# Altium footprint library Package_QFP.PcbLib: 84 footprints (part 3 of 6) (continued)
## LQFP-144_20x20mm_P0.5mm [mm]
pads (144):
  rrect25% 1.475x0.3 smd: 1(-10.663,8.75) 2(-10.663,8.25) 3(-10.663,7.75) 4(-10.663,7.25) 5(-10.663,6.75) 6(-10.663,6.25) 7(-10.663,5.75) 8(-10.663,5.25) 9(-10.663,4.75) 10(-10.663,4.25) 11(-10.663,3.75) 12(-10.663,3.25) 13(-10.663,2.75) 14(-10.663,2.25) 15(-10.663,1.75) 16(-10.663,1.25) 17(-10.663,0.75) 18(-10.663,0.25) 19(-10.663,-0.25) 20(-10.663,-0.75) 21(-10.663,-1.25) 22(-10.663,-1.75) 23(-10.663,-2.25) 24(-10.663,-2.75) 25(-10.663,-3.25) 26(-10.663,-3.75) 27(-10.663,-4.25) 28(-10.663,-4.75) 29(-10.663,-5.25) 30(-10.663,-5.75) 31(-10.663,-6.25) 32(-10.663,-6.75) 33(-10.663,-7.25) 34(-10.663,-7.75) 35(-10.663,-8.25) 36(-10.663,-8.75) 73(10.663,-8.75) 74(10.663,-8.25) 75(10.663,-7.75) 76(10.663,-7.25) 77(10.663,-6.75) 78(10.663,-6.25) 79(10.663,-5.75) 80(10.663,-5.25) 81(10.663,-4.75) 82(10.663,-4.25) 83(10.663,-3.75) 84(10.663,-3.25) 85(10.663,-2.75) 86(10.663,-2.25) 87(10.663,-1.75) 88(10.663,-1.25) 89(10.663,-0.75) 90(10.663,-0.25) 91(10.663,0.25) 92(10.663,0.75) 93(10.663,1.25) 94(10.663,1.75) 95(10.663,2.25) 96(10.663,2.75) 97(10.663,3.25) 98(10.663,3.75) 99(10.663,4.25) 100(10.663,4.75) 101(10.663,5.25) 102(10.663,5.75) 103(10.663,6.25) 104(10.663,6.75) 105(10.663,7.25) 106(10.663,7.75) 107(10.663,8.25) 108(10.663,8.75)
  rrect25% 0.3x1.475 smd: 37(-8.75,-10.663) 38(-8.25,-10.663) 39(-7.75,-10.663) 40(-7.25,-10.663) 41(-6.75,-10.663) 42(-6.25,-10.663) 43(-5.75,-10.663) 44(-5.25,-10.663) 45(-4.75,-10.663) 46(-4.25,-10.663) 47(-3.75,-10.663) 48(-3.25,-10.663) 49(-2.75,-10.663) 50(-2.25,-10.663) 51(-1.75,-10.663) 52(-1.25,-10.663) 53(-0.75,-10.663) 54(-0.25,-10.663) 55(0.25,-10.663) 56(0.75,-10.663) 57(1.25,-10.663) 58(1.75,-10.663) 59(2.25,-10.663) 60(2.75,-10.663) 61(3.25,-10.663) 62(3.75,-10.663) 63(4.25,-10.663) 64(4.75,-10.663) 65(5.25,-10.663) 66(5.75,-10.663) 67(6.25,-10.663) 68(6.75,-10.663) 69(7.25,-10.663) 70(7.75,-10.663) 71(8.25,-10.663) 72(8.75,-10.663) 109(8.75,10.663) 110(8.25,10.663) 111(7.75,10.663) 112(7.25,10.663) 113(6.75,10.663) 114(6.25,10.663) 115(5.75,10.663) 116(5.25,10.663) 117(4.75,10.663) 118(4.25,10.663) 119(3.75,10.663) 120(3.25,10.663) 121(2.75,10.663) 122(2.25,10.663) 123(1.75,10.663) 124(1.25,10.663) 125(0.75,10.663) 126(0.25,10.663) 127(-0.25,10.663) 128(-0.75,10.663) 129(-1.25,10.663) 130(-1.75,10.663) 131(-2.25,10.663) 132(-2.75,10.663) 133(-3.25,10.663) 134(-3.75,10.663) 135(-4.25,10.663) 136(-4.75,10.663) 137(-5.25,10.663) 138(-5.75,10.663) 139(-6.25,10.663) 140(-6.75,10.663) 141(-7.25,10.663) 142(-7.75,10.663) 143(-8.25,10.663) 144(-8.75,10.663)
F.SilkS:
  lines w0.12: -11.4,9.16 -10.11,9.16 -10.11,10.11 -9.16,10.11 ; -10.11,-9.16 -10.11,-10.11 -9.16,-10.11 ; 9.16,-10.11 10.11,-10.11 10.11,-9.16 ; 9.16,10.11 10.11,10.11 10.11,9.16
F.CrtYd:
  lines w0.05: -11.65,-9.15 -11.65,0 -11.65,9.15 -10.25,9.15 -10.25,10.25 -9.15,10.25 -9.15,11.65 0,11.65 9.15,11.65 9.15,10.25 10.25,10.25 10.25,9.15 11.65,9.15 11.65,0 11.65,-9.15 10.25,-9.15 10.25,-10.25 9.15,-10.25 9.15,-11.65 0,-11.65 -9.15,-11.65 -9.15,-10.25 -10.25,-10.25 -10.25,-9.15 -11.65,-9.15
F.Fab:
  lines w0.1: -10,-10 10,-10 10,10 -9,10 -10,9 -10,-10
  text "'.Designator'" at -3.897,-0.357 h1
3D body "LQFP-144_20x20mm_P0.5mm.step": height 1.5, standoff 0, extent -11,-11 11,11

## LQFP-160_24x24mm_P0.5mm [mm]
pads (160):
  rrect25% 1.5x0.3 smd: 1(-12.675,9.75) 2(-12.675,9.25) 3(-12.675,8.75) 4(-12.675,8.25) 5(-12.675,7.75) 6(-12.675,7.25) 7(-12.675,6.75) 8(-12.675,6.25) 9(-12.675,5.75) 10(-12.675,5.25) 11(-12.675,4.75) 12(-12.675,4.25) 13(-12.675,3.75) 14(-12.675,3.25) 15(-12.675,2.75) 16(-12.675,2.25) 17(-12.675,1.75) 18(-12.675,1.25) 19(-12.675,0.75) 20(-12.675,0.25) 21(-12.675,-0.25) 22(-12.675,-0.75) 23(-12.675,-1.25) 24(-12.675,-1.75) 25(-12.675,-2.25) 26(-12.675,-2.75) 27(-12.675,-3.25) 28(-12.675,-3.75) 29(-12.675,-4.25) 30(-12.675,-4.75) 31(-12.675,-5.25) 32(-12.675,-5.75) 33(-12.675,-6.25) 34(-12.675,-6.75) 35(-12.675,-7.25) 36(-12.675,-7.75) 37(-12.675,-8.25) 38(-12.675,-8.75) 39(-12.675,-9.25) 40(-12.675,-9.75) 81(12.675,-9.75) 82(12.675,-9.25) 83(12.675,-8.75) 84(12.675,-8.25) 85(12.675,-7.75) 86(12.675,-7.25) 87(12.675,-6.75) 88(12.675,-6.25) 89(12.675,-5.75) 90(12.675,-5.25) 91(12.675,-4.75) 92(12.675,-4.25) 93(12.675,-3.75) 94(12.675,-3.25) 95(12.675,-2.75) 96(12.675,-2.25) 97(12.675,-1.75) 98(12.675,-1.25) 99(12.675,-0.75) 100(12.675,-0.25) 101(12.675,0.25) 102(12.675,0.75) 103(12.675,1.25) 104(12.675,1.75) 105(12.675,2.25) 106(12.675,2.75) 107(12.675,3.25) 108(12.675,3.75) 109(12.675,4.25) 110(12.675,4.75) 111(12.675,5.25) 112(12.675,5.75) 113(12.675,6.25) 114(12.675,6.75) 115(12.675,7.25) 116(12.675,7.75) 117(12.675,8.25) 118(12.675,8.75) 119(12.675,9.25) 120(12.675,9.75)
  rrect25% 0.3x1.5 smd: 41(-9.75,-12.675) 42(-9.25,-12.675) 43(-8.75,-12.675) 44(-8.25,-12.675) 45(-7.75,-12.675) 46(-7.25,-12.675) 47(-6.75,-12.675) 48(-6.25,-12.675) 49(-5.75,-12.675) 50(-5.25,-12.675) 51(-4.75,-12.675) 52(-4.25,-12.675) 53(-3.75,-12.675) 54(-3.25,-12.675) 55(-2.75,-12.675) 56(-2.25,-12.675) 57(-1.75,-12.675) 58(-1.25,-12.675) 59(-0.75,-12.675) 60(-0.25,-12.675) 61(0.25,-12.675) 62(0.75,-12.675) 63(1.25,-12.675) 64(1.75,-12.675) 65(2.25,-12.675) 66(2.75,-12.675) 67(3.25,-12.675) 68(3.75,-12.675) 69(4.25,-12.675) 70(4.75,-12.675) 71(5.25,-12.675) 72(5.75,-12.675) 73(6.25,-12.675) 74(6.75,-12.675) 75(7.25,-12.675) 76(7.75,-12.675) 77(8.25,-12.675) 78(8.75,-12.675) 79(9.25,-12.675) 80(9.75,-12.675) 121(9.75,12.675) 122(9.25,12.675) 123(8.75,12.675) 124(8.25,12.675) 125(7.75,12.675) 126(7.25,12.675) 127(6.75,12.675) 128(6.25,12.675) 129(5.75,12.675) 130(5.25,12.675) 131(4.75,12.675) 132(4.25,12.675) 133(3.75,12.675) 134(3.25,12.675) 135(2.75,12.675) 136(2.25,12.675) 137(1.75,12.675) 138(1.25,12.675) 139(0.75,12.675) 140(0.25,12.675) 141(-0.25,12.675) 142(-0.75,12.675) 143(-1.25,12.675) 144(-1.75,12.675) 145(-2.25,12.675) 146(-2.75,12.675) 147(-3.25,12.675) 148(-3.75,12.675) 149(-4.25,12.675) 150(-4.75,12.675) 151(-5.25,12.675) 152(-5.75,12.675) 153(-6.25,12.675) 154(-6.75,12.675) 155(-7.25,12.675) 156(-7.75,12.675) 157(-8.25,12.675) 158(-8.75,12.675) 159(-9.25,12.675) 160(-9.75,12.675)
F.SilkS:
  lines w0.12: -13.425,10.16 -12.11,10.16 -12.11,12.11 -10.16,12.11 ; -12.11,-10.16 -12.11,-12.11 -10.16,-12.11 ; 10.16,-12.11 12.11,-12.11 12.11,-10.16 ; 10.16,12.11 12.11,12.11 12.11,10.16
F.CrtYd:
  lines w0.05: -13.68,-10.15 -13.68,0 -13.68,10.15 -12.25,10.15 -12.25,12.25 -10.15,12.25 -10.15,13.68 0,13.68 10.15,13.68 10.15,12.25 12.25,12.25 12.25,10.15 13.68,10.15 13.68,0 13.68,-10.15 12.25,-10.15 12.25,-12.25 10.15,-12.25 10.15,-13.68 0,-13.68 -10.15,-13.68 -10.15,-12.25 -12.25,-12.25 -12.25,-10.15 -13.68,-10.15
F.Fab:
  lines w0.1: -12,-12 -12,11 -11,12 12,12 12,-12 -12,-12
  text "'.Designator'" at -4.047,-0.84 h1
3D body "LQFP-160_24x24mm_P0.5mm.step": height 1.5, standoff 0, extent -13,-13 13,13

## LQFP-176_20x20mm_P0.4mm [mm]
pads (176):
  rrect25% 1.475x0.2 smd: 1(-10.713,8.6) 2(-10.713,8.2) 3(-10.713,7.8) 4(-10.713,7.4) 5(-10.713,7) 6(-10.713,6.6) 7(-10.713,6.2) 8(-10.713,5.8) 9(-10.713,5.4) 10(-10.713,5) 11(-10.713,4.6) 12(-10.713,4.2) 13(-10.713,3.8) 14(-10.713,3.4) 15(-10.713,3) 16(-10.713,2.6) 17(-10.713,2.2) 18(-10.713,1.8) 19(-10.713,1.4) 20(-10.713,1) 21(-10.713,0.6) 22(-10.713,0.2) 23(-10.713,-0.2) 24(-10.713,-0.6) 25(-10.713,-1) 26(-10.713,-1.4) 27(-10.713,-1.8) 28(-10.713,-2.2) 29(-10.713,-2.6) 30(-10.713,-3) 31(-10.713,-3.4) 32(-10.713,-3.8) 33(-10.713,-4.2) 34(-10.713,-4.6) 35(-10.713,-5) 36(-10.713,-5.4) 37(-10.713,-5.8) 38(-10.713,-6.2) 39(-10.713,-6.6) 40(-10.713,-7) 41(-10.713,-7.4) 42(-10.713,-7.8) 43(-10.713,-8.2) 44(-10.713,-8.6) 89(10.713,-8.6) 90(10.713,-8.2) 91(10.713,-7.8) 92(10.713,-7.4) 93(10.713,-7) 94(10.713,-6.6) 95(10.713,-6.2) 96(10.713,-5.8) 97(10.713,-5.4) 98(10.713,-5) 99(10.713,-4.6) 100(10.713,-4.2) 101(10.713,-3.8) 102(10.713,-3.4) 103(10.713,-3) 104(10.713,-2.6) 105(10.713,-2.2) 106(10.713,-1.8) 107(10.713,-1.4) 108(10.713,-1) 109(10.713,-0.6) 110(10.713,-0.2) 111(10.713,0.2) 112(10.713,0.6) 113(10.713,1) 114(10.713,1.4) 115(10.713,1.8) 116(10.713,2.2) 117(10.713,2.6) 118(10.713,3) 119(10.713,3.4) 120(10.713,3.8) 121(10.713,4.2) 122(10.713,4.6) 123(10.713,5) 124(10.713,5.4) 125(10.713,5.8) 126(10.713,6.2) 127(10.713,6.6) 128(10.713,7) 129(10.713,7.4) 130(10.713,7.8) 131(10.713,8.2) 132(10.713,8.6)
  rrect25% 0.2x1.475 smd: 45(-8.6,-10.713) 46(-8.2,-10.713) 47(-7.8,-10.713) 48(-7.4,-10.713) 49(-7,-10.713) 50(-6.6,-10.713) 51(-6.2,-10.713) 52(-5.8,-10.713) 53(-5.4,-10.713) 54(-5,-10.713) 55(-4.6,-10.713) 56(-4.2,-10.713) 57(-3.8,-10.713) 58(-3.4,-10.713) 59(-3,-10.713) 60(-2.6,-10.713) 61(-2.2,-10.713) 62(-1.8,-10.713) 63(-1.4,-10.713) 64(-1,-10.713) 65(-0.6,-10.713) 66(-0.2,-10.713) 67(0.2,-10.713) 68(0.6,-10.713) 69(1,-10.713) 70(1.4,-10.713) 71(1.8,-10.713) 72(2.2,-10.713) 73(2.6,-10.713) 74(3,-10.713) 75(3.4,-10.713) 76(3.8,-10.713) 77(4.2,-10.713) 78(4.6,-10.713) 79(5,-10.713) 80(5.4,-10.713) 81(5.8,-10.713) 82(6.2,-10.713) 83(6.6,-10.713) 84(7,-10.713) 85(7.4,-10.713) 86(7.8,-10.713) 87(8.2,-10.713) 88(8.6,-10.713) 133(8.6,10.713) 134(8.2,10.713) 135(7.8,10.713) 136(7.4,10.713) 137(7,10.713) 138(6.6,10.713) 139(6.2,10.713) 140(5.8,10.713) 141(5.4,10.713) 142(5,10.713) 143(4.6,10.713) 144(4.2,10.713) 145(3.8,10.713) 146(3.4,10.713) 147(3,10.713) 148(2.6,10.713) 149(2.2,10.713) 150(1.8,10.713) 151(1.4,10.713) 152(1,10.713) 153(0.6,10.713) 154(0.2,10.713) 155(-0.2,10.713) 156(-0.6,10.713) 157(-1,10.713) 158(-1.4,10.713) 159(-1.8,10.713) 160(-2.2,10.713) 161(-2.6,10.713) 162(-3,10.713) 163(-3.4,10.713) 164(-3.8,10.713) 165(-4.2,10.713) 166(-4.6,10.713) 167(-5,10.713) 168(-5.4,10.713) 169(-5.8,10.713) 170(-6.2,10.713) 171(-6.6,10.713) 172(-7,10.713) 173(-7.4,10.713) 174(-7.8,10.713) 175(-8.2,10.713) 176(-8.6,10.713)
F.SilkS:
  lines w0.12: -11.45,8.96 -10.11,8.96 -10.11,10.11 -8.96,10.11 ; -10.11,-8.96 -10.11,-10.11 -8.96,-10.11 ; 8.96,-10.11 10.11,-10.11 10.11,-8.96 ; 8.96,10.11 10.11,10.11 10.11,8.96
F.CrtYd:
  lines w0.05: -11.7,-8.95 -10.25,-8.95 -10.25,-10.25 -8.95,-10.25 -8.95,-11.7 0,-11.7 8.95,-11.7 8.95,-10.25 10.25,-10.25 10.25,-8.95 11.7,-8.95 11.7,0 11.7,8.95 10.25,8.95 10.25,10.25 8.95,10.25 8.95,11.7 0,11.7 -8.95,11.7 -8.95,10.25 -10.25,10.25 -10.25,8.95 -11.7,8.95 -11.7,0 -11.7,-8.95
F.Fab:
  lines w0.1: -10,-10 -10,9 -9,10 10,10 10,-10 -10,-10
  text "'.Designator'" at -4.047,-0.84 h1
3D body "LQFP-176_20x20mm_P0.4mm.step": height 1.5, standoff 0, extent -11,-11 11,11

## LQFP-176_24x24mm_P0.5mm [mm]
pads (176):
  rrect25% 1.5x0.3 smd: 1(-12.675,10.75) 2(-12.675,10.25) 3(-12.675,9.75) 4(-12.675,9.25) 5(-12.675,8.75) 6(-12.675,8.25) 7(-12.675,7.75) 8(-12.675,7.25) 9(-12.675,6.75) 10(-12.675,6.25) 11(-12.675,5.75) 12(-12.675,5.25) 13(-12.675,4.75) 14(-12.675,4.25) 15(-12.675,3.75) 16(-12.675,3.25) 17(-12.675,2.75) 18(-12.675,2.25) 19(-12.675,1.75) 20(-12.675,1.25) 21(-12.675,0.75) 22(-12.675,0.25) 23(-12.675,-0.25) 24(-12.675,-0.75) 25(-12.675,-1.25) 26(-12.675,-1.75) 27(-12.675,-2.25) 28(-12.675,-2.75) 29(-12.675,-3.25) 30(-12.675,-3.75) 31(-12.675,-4.25) 32(-12.675,-4.75) 33(-12.675,-5.25) 34(-12.675,-5.75) 35(-12.675,-6.25) 36(-12.675,-6.75) 37(-12.675,-7.25) 38(-12.675,-7.75) 39(-12.675,-8.25) 40(-12.675,-8.75) 41(-12.675,-9.25) 42(-12.675,-9.75) 43(-12.675,-10.25) 44(-12.675,-10.75) 89(12.675,-10.75) 90(12.675,-10.25) 91(12.675,-9.75) 92(12.675,-9.25) 93(12.675,-8.75) 94(12.675,-8.25) 95(12.675,-7.75) 96(12.675,-7.25) 97(12.675,-6.75) 98(12.675,-6.25) 99(12.675,-5.75) 100(12.675,-5.25) 101(12.675,-4.75) 102(12.675,-4.25) 103(12.675,-3.75) 104(12.675,-3.25) 105(12.675,-2.75) 106(12.675,-2.25) 107(12.675,-1.75) 108(12.675,-1.25) 109(12.675,-0.75) 110(12.675,-0.25) 111(12.675,0.25) 112(12.675,0.75) 113(12.675,1.25) 114(12.675,1.75) 115(12.675,2.25) 116(12.675,2.75) 117(12.675,3.25) 118(12.675,3.75) 119(12.675,4.25) 120(12.675,4.75) 121(12.675,5.25) 122(12.675,5.75) 123(12.675,6.25) 124(12.675,6.75) 125(12.675,7.25) 126(12.675,7.75) 127(12.675,8.25) 128(12.675,8.75) 129(12.675,9.25) 130(12.675,9.75) 131(12.675,10.25) 132(12.675,10.75)
  rrect25% 0.3x1.5 smd: 45(-10.75,-12.675) 46(-10.25,-12.675) 47(-9.75,-12.675) 48(-9.25,-12.675) 49(-8.75,-12.675) 50(-8.25,-12.675) 51(-7.75,-12.675) 52(-7.25,-12.675) 53(-6.75,-12.675) 54(-6.25,-12.675) 55(-5.75,-12.675) 56(-5.25,-12.675) 57(-4.75,-12.675) 58(-4.25,-12.675) 59(-3.75,-12.675) 60(-3.25,-12.675) 61(-2.75,-12.675) 62(-2.25,-12.675) 63(-1.75,-12.675) 64(-1.25,-12.675) 65(-0.75,-12.675) 66(-0.25,-12.675) 67(0.25,-12.675) 68(0.75,-12.675) 69(1.25,-12.675) 70(1.75,-12.675) 71(2.25,-12.675) 72(2.75,-12.675) 73(3.25,-12.675) 74(3.75,-12.675) 75(4.25,-12.675) 76(4.75,-12.675) 77(5.25,-12.675) 78(5.75,-12.675) 79(6.25,-12.675) 80(6.75,-12.675) 81(7.25,-12.675) 82(7.75,-12.675) 83(8.25,-12.675) 84(8.75,-12.675) 85(9.25,-12.675) 86(9.75,-12.675) 87(10.25,-12.675) 88(10.75,-12.675) 133(10.75,12.675) 134(10.25,12.675) 135(9.75,12.675) 136(9.25,12.675) 137(8.75,12.675) 138(8.25,12.675) 139(7.75,12.675) 140(7.25,12.675) 141(6.75,12.675) 142(6.25,12.675) 143(5.75,12.675) 144(5.25,12.675) 145(4.75,12.675) 146(4.25,12.675) 147(3.75,12.675) 148(3.25,12.675) 149(2.75,12.675) 150(2.25,12.675) 151(1.75,12.675) 152(1.25,12.675) 153(0.75,12.675) 154(0.25,12.675) 155(-0.25,12.675) 156(-0.75,12.675) 157(-1.25,12.675) 158(-1.75,12.675) 159(-2.25,12.675) 160(-2.75,12.675) 161(-3.25,12.675) 162(-3.75,12.675) 163(-4.25,12.675) 164(-4.75,12.675) 165(-5.25,12.675) 166(-5.75,12.675) 167(-6.25,12.675) 168(-6.75,12.675) 169(-7.25,12.675) 170(-7.75,12.675) 171(-8.25,12.675) 172(-8.75,12.675) 173(-9.25,12.675) 174(-9.75,12.675) 175(-10.25,12.675) 176(-10.75,12.675)
F.SilkS:
  lines w0.12: -13.425,11.16 -12.11,11.16 -12.11,12.11 -11.16,12.11 ; -12.11,-11.16 -12.11,-12.11 -11.16,-12.11 ; 11.16,-12.11 12.11,-12.11 12.11,-11.16 ; 11.16,12.11 12.11,12.11 12.11,11.16
F.CrtYd:
  lines w0.05: -13.68,-11.15 -12.25,-11.15 -12.25,-12.25 -11.15,-12.25 -11.15,-13.68 0,-13.68 11.15,-13.68 11.15,-12.25 12.25,-12.25 12.25,-11.15 13.68,-11.15 13.68,0 13.68,11.15 12.25,11.15 12.25,12.25 11.15,12.25 11.15,13.68 0,13.68 -11.15,13.68 -11.15,12.25 -12.25,12.25 -12.25,11.15 -13.68,11.15 -13.68,0 -13.68,-11.15
F.Fab:
  lines w0.1: -12,-12 -12,11 -11,12 12,12 12,-12 -12,-12
  text "'.Designator'" at -4.047,-0.84 h1
3D body "LQFP-176_24x24mm_P0.5mm.step": height 1.5, standoff 0, extent -13,-13 13,13

## LQFP-208_28x28mm_P0.5mm [mm]
pads (208):
  rrect25% 1.5x0.3 smd: 1(-14.675,12.75) 2(-14.675,12.25) 3(-14.675,11.75) 4(-14.675,11.25) 5(-14.675,10.75) 6(-14.675,10.25) 7(-14.675,9.75) 8(-14.675,9.25) 9(-14.675,8.75) 10(-14.675,8.25) 11(-14.675,7.75) 12(-14.675,7.25) 13(-14.675,6.75) 14(-14.675,6.25) 15(-14.675,5.75) 16(-14.675,5.25) 17(-14.675,4.75) 18(-14.675,4.25) 19(-14.675,3.75) 20(-14.675,3.25) 21(-14.675,2.75) 22(-14.675,2.25) 23(-14.675,1.75) 24(-14.675,1.25) 25(-14.675,0.75) 26(-14.675,0.25) 27(-14.675,-0.25) 28(-14.675,-0.75) 29(-14.675,-1.25) 30(-14.675,-1.75) 31(-14.675,-2.25) 32(-14.675,-2.75) 33(-14.675,-3.25) 34(-14.675,-3.75) 35(-14.675,-4.25) 36(-14.675,-4.75) 37(-14.675,-5.25) 38(-14.675,-5.75) 39(-14.675,-6.25) 40(-14.675,-6.75) 41(-14.675,-7.25) 42(-14.675,-7.75) 43(-14.675,-8.25) 44(-14.675,-8.75) 45(-14.675,-9.25) 46(-14.675,-9.75) 47(-14.675,-10.25) 48(-14.675,-10.75) 49(-14.675,-11.25) 50(-14.675,-11.75) 51(-14.675,-12.25) 52(-14.675,-12.75) 105(14.675,-12.75) 106(14.675,-12.25) 107(14.675,-11.75) 108(14.675,-11.25) 109(14.675,-10.75) 110(14.675,-10.25) 111(14.675,-9.75) 112(14.675,-9.25) 113(14.675,-8.75) 114(14.675,-8.25) 115(14.675,-7.75) 116(14.675,-7.25) 117(14.675,-6.75) 118(14.675,-6.25) 119(14.675,-5.75) 120(14.675,-5.25) 121(14.675,-4.75) 122(14.675,-4.25) 123(14.675,-3.75) 124(14.675,-3.25) 125(14.675,-2.75) 126(14.675,-2.25) 127(14.675,-1.75) 128(14.675,-1.25) 129(14.675,-0.75) 130(14.675,-0.25) 131(14.675,0.25) 132(14.675,0.75) 133(14.675,1.25) 134(14.675,1.75) 135(14.675,2.25) 136(14.675,2.75) 137(14.675,3.25) 138(14.675,3.75) 139(14.675,4.25) 140(14.675,4.75) 141(14.675,5.25) 142(14.675,5.75) 143(14.675,6.25) 144(14.675,6.75) 145(14.675,7.25) 146(14.675,7.75) 147(14.675,8.25) 148(14.675,8.75) 149(14.675,9.25) 150(14.675,9.75) 151(14.675,10.25) 152(14.675,10.75) 153(14.675,11.25) 154(14.675,11.75) 155(14.675,12.25) 156(14.675,12.75)
  rrect25% 0.3x1.5 smd: 53(-12.75,-14.675) 54(-12.25,-14.675) 55(-11.75,-14.675) 56(-11.25,-14.675) 57(-10.75,-14.675) 58(-10.25,-14.675) 59(-9.75,-14.675) 60(-9.25,-14.675) 61(-8.75,-14.675) 62(-8.25,-14.675) 63(-7.75,-14.675) 64(-7.25,-14.675) 65(-6.75,-14.675) 66(-6.25,-14.675) 67(-5.75,-14.675) 68(-5.25,-14.675) 69(-4.75,-14.675) 70(-4.25,-14.675) 71(-3.75,-14.675) 72(-3.25,-14.675) 73(-2.75,-14.675) 74(-2.25,-14.675) 75(-1.75,-14.675) 76(-1.25,-14.675) 77(-0.75,-14.675) 78(-0.25,-14.675) 79(0.25,-14.675) 80(0.75,-14.675) 81(1.25,-14.675) 82(1.75,-14.675) 83(2.25,-14.675) 84(2.75,-14.675) 85(3.25,-14.675) 86(3.75,-14.675) 87(4.25,-14.675) 88(4.75,-14.675) 89(5.25,-14.675) 90(5.75,-14.675) 91(6.25,-14.675) 92(6.75,-14.675) 93(7.25,-14.675) 94(7.75,-14.675) 95(8.25,-14.675) 96(8.75,-14.675) 97(9.25,-14.675) 98(9.75,-14.675) 99(10.25,-14.675) 100(10.75,-14.675) 101(11.25,-14.675) 102(11.75,-14.675) 103(12.25,-14.675) 104(12.75,-14.675) 157(12.75,14.675) 158(12.25,14.675) 159(11.75,14.675) 160(11.25,14.675) 161(10.75,14.675) 162(10.25,14.675) 163(9.75,14.675) 164(9.25,14.675) 165(8.75,14.675) 166(8.25,14.675) 167(7.75,14.675) 168(7.25,14.675) 169(6.75,14.675) 170(6.25,14.675) 171(5.75,14.675) 172(5.25,14.675) 173(4.75,14.675) 174(4.25,14.675) 175(3.75,14.675) 176(3.25,14.675) 177(2.75,14.675) 178(2.25,14.675) 179(1.75,14.675) 180(1.25,14.675) 181(0.75,14.675) 182(0.25,14.675) 183(-0.25,14.675) 184(-0.75,14.675) 185(-1.25,14.675) 186(-1.75,14.675) 187(-2.25,14.675) 188(-2.75,14.675) 189(-3.25,14.675) 190(-3.75,14.675) 191(-4.25,14.675) 192(-4.75,14.675) 193(-5.25,14.675) 194(-5.75,14.675) 195(-6.25,14.675) 196(-6.75,14.675) 197(-7.25,14.675) 198(-7.75,14.675) 199(-8.25,14.675) 200(-8.75,14.675) 201(-9.25,14.675) 202(-9.75,14.675) 203(-10.25,14.675) 204(-10.75,14.675) 205(-11.25,14.675) 206(-11.75,14.675) 207(-12.25,14.675) 208(-12.75,14.675)
F.SilkS:
  lines w0.12: -15.425,13.16 -14.11,13.16 -14.11,14.11 -13.16,14.11 ; -14.11,-13.16 -14.11,-14.11 -13.16,-14.11 ; 13.16,-14.11 14.11,-14.11 14.11,-13.16 ; 13.16,14.11 14.11,14.11 14.11,13.16
F.CrtYd:
  lines w0.05: -15.68,-13.15 -14.25,-13.15 -14.25,-14.25 -13.15,-14.25 -13.15,-15.68 0,-15.68 13.15,-15.68 13.15,-14.25 14.25,-14.25 14.25,-13.15 15.68,-13.15 15.68,0 15.68,13.15 14.25,13.15 14.25,14.25 13.15,14.25 13.15,15.68 0,15.68 -13.15,15.68 -13.15,14.25 -14.25,14.25 -14.25,13.15 -15.68,13.15 -15.68,0 -15.68,-13.15
F.Fab:
  lines w0.1: -14,-14 14,-14 14,14 -13,14 -14,13 -14,-14
  text "'.Designator'" at -4.047,-0.84 h1
3D body "LQFP-208_28x28mm_P0.5mm.step": height 1.5, standoff 0, extent -15,-15 15,15

## LQFP-216_24x24mm_P0.4mm [mm]
pads (216):
  rrect25% 1.475x0.25 smd: 1(-12.662,10.6) 2(-12.662,10.2) 3(-12.662,9.8) 4(-12.662,9.4) 5(-12.662,9) 6(-12.662,8.6) 7(-12.662,8.2) 8(-12.662,7.8) 9(-12.662,7.4) 10(-12.662,7) 11(-12.662,6.6) 12(-12.662,6.2) 13(-12.662,5.8) 14(-12.662,5.4) 15(-12.662,5) 16(-12.662,4.6) 17(-12.662,4.2) 18(-12.662,3.8) 19(-12.662,3.4) 20(-12.662,3) 21(-12.662,2.6) 22(-12.662,2.2) 23(-12.662,1.8) 24(-12.662,1.4) 25(-12.662,1) 26(-12.662,0.6) 27(-12.662,0.2) 28(-12.662,-0.2) 29(-12.662,-0.6) 30(-12.662,-1) 31(-12.662,-1.4) 32(-12.662,-1.8) 33(-12.662,-2.2) 34(-12.662,-2.6) 35(-12.662,-3) 36(-12.662,-3.4) 37(-12.662,-3.8) 38(-12.662,-4.2) 39(-12.662,-4.6) 40(-12.662,-5) 41(-12.662,-5.4) 42(-12.662,-5.8) 43(-12.662,-6.2) 44(-12.662,-6.6) 45(-12.662,-7) 46(-12.662,-7.4) 47(-12.662,-7.8) 48(-12.662,-8.2) 49(-12.662,-8.6) 50(-12.662,-9) 51(-12.662,-9.4) 52(-12.662,-9.8) 53(-12.662,-10.2) 54(-12.662,-10.6) 109(12.662,-10.6) 110(12.662,-10.2) 111(12.662,-9.8) 112(12.662,-9.4) 113(12.662,-9) 114(12.662,-8.6) 115(12.662,-8.2) 116(12.662,-7.8) 117(12.662,-7.4) 118(12.662,-7) 119(12.662,-6.6) 120(12.662,-6.2) 121(12.662,-5.8) 122(12.662,-5.4) 123(12.662,-5) 124(12.662,-4.6) 125(12.662,-4.2) 126(12.662,-3.8) 127(12.662,-3.4) 128(12.662,-3) 129(12.662,-2.6) 130(12.662,-2.2) 131(12.662,-1.8) 132(12.662,-1.4) 133(12.662,-1) 134(12.662,-0.6) 135(12.662,-0.2) 136(12.662,0.2) 137(12.662,0.6) 138(12.662,1) 139(12.662,1.4) 140(12.662,1.8) 141(12.662,2.2) 142(12.662,2.6) 143(12.662,3) 144(12.662,3.4) 145(12.662,3.8) 146(12.662,4.2) 147(12.662,4.6) 148(12.662,5) 149(12.662,5.4) 150(12.662,5.8) 151(12.662,6.2) 152(12.662,6.6) 153(12.662,7) 154(12.662,7.4) 155(12.662,7.8) 156(12.662,8.2) 157(12.662,8.6) 158(12.662,9) 159(12.662,9.4) 160(12.662,9.8) 161(12.662,10.2) 162(12.662,10.6)
  rrect25% 0.25x1.475 smd: 55(-10.6,-12.662) 56(-10.2,-12.662) 57(-9.8,-12.662) 58(-9.4,-12.662) 59(-9,-12.662) 60(-8.6,-12.662) 61(-8.2,-12.662) 62(-7.8,-12.662) 63(-7.4,-12.662) 64(-7,-12.662) 65(-6.6,-12.662) 66(-6.2,-12.662) 67(-5.8,-12.662) 68(-5.4,-12.662) 69(-5,-12.662) 70(-4.6,-12.662) 71(-4.2,-12.662) 72(-3.8,-12.662) 73(-3.4,-12.662) 74(-3,-12.662) 75(-2.6,-12.662) 76(-2.2,-12.662) 77(-1.8,-12.662) 78(-1.4,-12.662) 79(-1,-12.662) 80(-0.6,-12.662) 81(-0.2,-12.662) 82(0.2,-12.662) 83(0.6,-12.662) 84(1,-12.662) 85(1.4,-12.662) 86(1.8,-12.662) 87(2.2,-12.662) 88(2.6,-12.662) 89(3,-12.662) 90(3.4,-12.662) 91(3.8,-12.662) 92(4.2,-12.662) 93(4.6,-12.662) 94(5,-12.662) 95(5.4,-12.662) 96(5.8,-12.662) 97(6.2,-12.662) 98(6.6,-12.662) 99(7,-12.662) 100(7.4,-12.662) 101(7.8,-12.662) 102(8.2,-12.662) 103(8.6,-12.662) 104(9,-12.662) 105(9.4,-12.662) 106(9.8,-12.662) 107(10.2,-12.662) 108(10.6,-12.662) 163(10.6,12.662) 164(10.2,12.662) 165(9.8,12.662) 166(9.4,12.662) 167(9,12.662) 168(8.6,12.662) 169(8.2,12.662) 170(7.8,12.662) 171(7.4,12.662) 172(7,12.662) 173(6.6,12.662) 174(6.2,12.662) 175(5.8,12.662) 176(5.4,12.662) 177(5,12.662) 178(4.6,12.662) 179(4.2,12.662) 180(3.8,12.662) 181(3.4,12.662) 182(3,12.662) 183(2.6,12.662) 184(2.2,12.662) 185(1.8,12.662) 186(1.4,12.662) 187(1,12.662) 188(0.6,12.662) 189(0.2,12.662) 190(-0.2,12.662) 191(-0.6,12.662) 192(-1,12.662) 193(-1.4,12.662) 194(-1.8,12.662) 195(-2.2,12.662) 196(-2.6,12.662) 197(-3,12.662) 198(-3.4,12.662) 199(-3.8,12.662) 200(-4.2,12.662) 201(-4.6,12.662) 202(-5,12.662) 203(-5.4,12.662) 204(-5.8,12.662) 205(-6.2,12.662) 206(-6.6,12.662) 207(-7,12.662) 208(-7.4,12.662) 209(-7.8,12.662) 210(-8.2,12.662) 211(-8.6,12.662) 212(-9,12.662) 213(-9.4,12.662) 214(-9.8,12.662) 215(-10.2,12.662) 216(-10.6,12.662)
F.SilkS:
  lines w0.12: -13.4,10.985 -12.11,10.985 -12.11,12.11 -10.985,12.11 ; -12.11,-10.985 -12.11,-12.11 -10.985,-12.11 ; 10.985,-12.11 12.11,-12.11 12.11,-10.985 ; 10.985,12.11 12.11,12.11 12.11,10.985
F.CrtYd:
  lines w0.05: -13.65,-10.98 -12.25,-10.98 -12.25,-12.25 -10.98,-12.25 -10.98,-13.65 0,-13.65 10.98,-13.65 10.98,-12.25 12.25,-12.25 12.25,-10.98 13.65,-10.98 13.65,0 13.65,10.98 12.25,10.98 12.25,12.25 10.98,12.25 10.98,13.65 0,13.65 -10.98,13.65 -10.98,12.25 -12.25,12.25 -12.25,10.98 -13.65,10.98 -13.65,0 -13.65,-10.98
F.Fab:
  lines w0.1: -12,-12 -12,11 -11,12 12,12 12,-12 -12,-12
  text "'.Designator'" at -4.047,-0.84 h1
3D body "LQFP-216_24x24mm_P0.4mm.step": height 1.5, standoff 0, extent -13,-13 13,13

## MQFP-44_10x10mm_P0.8mm [mm]
pads (44):
  rrect25% 1.875x0.55 smd: 1(-6.488,4) 2(-6.488,3.2) 3(-6.488,2.4) 4(-6.488,1.6) 5(-6.488,0.8) 6(-6.488,0) 7(-6.488,-0.8) 8(-6.488,-1.6) 9(-6.488,-2.4) 10(-6.488,-3.2) 11(-6.488,-4) 23(6.488,-4) 24(6.488,-3.2) 25(6.488,-2.4) 26(6.488,-1.6) 27(6.488,-0.8) 28(6.488,0) 29(6.488,0.8) 30(6.488,1.6) 31(6.488,2.4) 32(6.488,3.2) 33(6.488,4)
  rrect25% 0.55x1.875 smd: 12(-4,-6.488) 13(-3.2,-6.488) 14(-2.4,-6.488) 15(-1.6,-6.488) 16(-0.8,-6.488) 17(0,-6.488) 18(0.8,-6.488) 19(1.6,-6.488) 20(2.4,-6.488) 21(3.2,-6.488) 22(4,-6.488) 34(4,6.488) 35(3.2,6.488) 36(2.4,6.488) 37(1.6,6.488) 38(0.8,6.488) 39(0,6.488) 40(-0.8,6.488) 41(-1.6,6.488) 42(-2.4,6.488) 43(-3.2,6.488) 44(-4,6.488)
F.SilkS:
  lines w0.12: -7.425,4.535 -5.11,4.535 -5.11,5.11 -4.535,5.11 ; -5.11,-4.535 -5.11,-5.11 -4.535,-5.11 ; 4.535,-5.11 5.11,-5.11 5.11,-4.535 ; 4.535,5.11 5.11,5.11 5.11,4.535
F.CrtYd:
  lines w0.05: -7.68,-4.52 -5.25,-4.52 -5.25,-5.25 -4.52,-5.25 -4.52,-7.68 0,-7.68 4.52,-7.68 4.52,-5.25 5.25,-5.25 5.25,-4.52 7.68,-4.52 7.68,0 7.68,4.52 5.25,4.52 5.25,5.25 4.52,5.25 4.52,7.68 0,7.68 -4.52,7.68 -4.52,5.25 -5.25,5.25 -5.25,4.52 -7.68,4.52 -7.68,0 -7.68,-4.52
F.Fab:
  lines w0.1: -5,-5 -5,4 -4,5 5,5 5,-5 -5,-5
  text "'.Designator'" at -4.047,-0.84 h1
3D body "TQFP-44_10x10mm_P0.8mm.step": height 1.1, standoff 0, extent -6,-6 6,6